# Altium schematic symbol library Wurth_Elektronik_Passive_rev16a.SCHLIB: 1143 symbols (part 15 of 27) (continued)
## WE-TCI_0603 (continued)
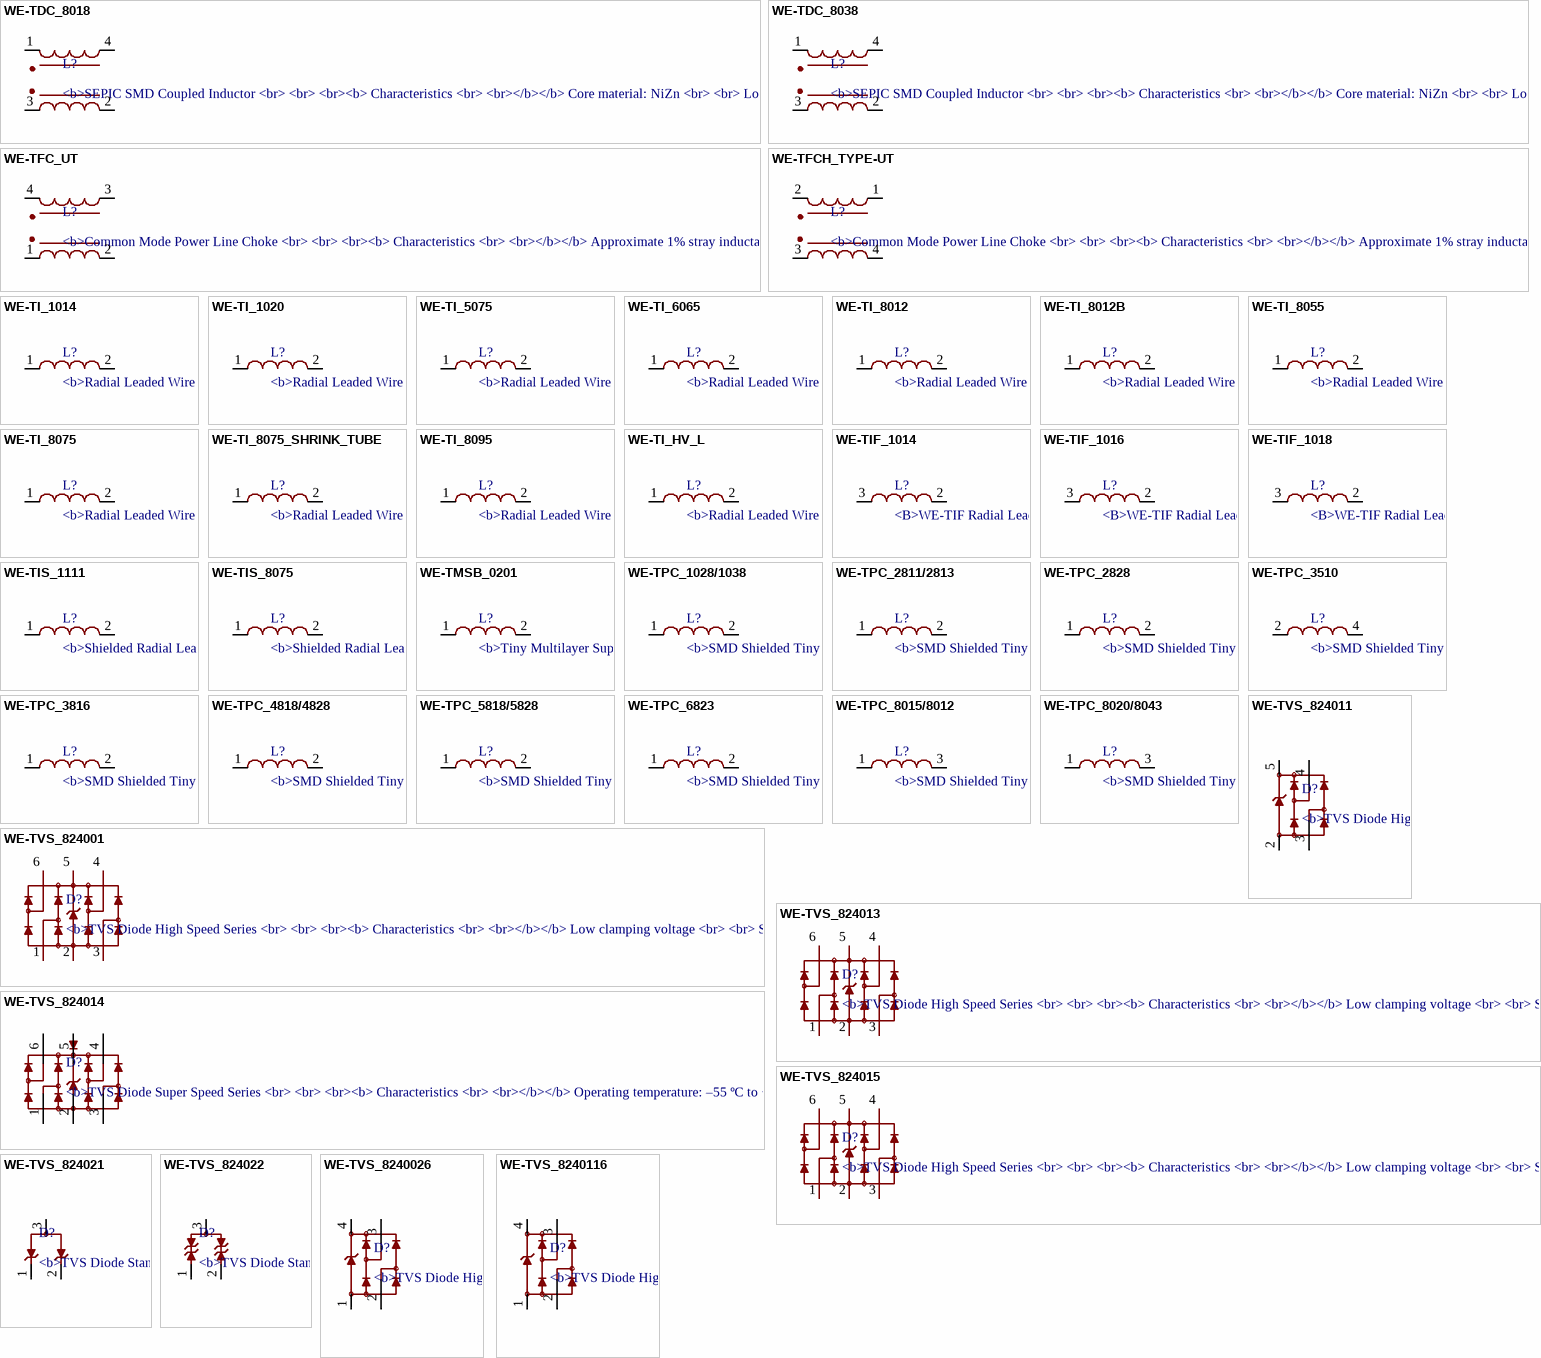
[diagram p46: symbols WE-TDC_8018 to WE-TVS_8240116]

## WE-TDC_8018
designator L?, comment <b>SEPIC SMD Coupled Inductor / <br> / <br> / <br><b> Characteristics / <br> / <br></b></b> Core material: NiZn / <br> / <br> Low profile / <br> / <br> Magnetical shielded which results in a low leakage field / <br> / <br> 8x8 mm case / <br> / <br> 1:1 transformer / <br> / <br> Low self-losses / <br> / <br> High self resonance frequency / <br> / <br> Coupled inductor with two identical windings / <br> / <br> Operating temperature: –40 °C up to +125 °C / <br> / <br> / <br> <b> Applications / <br> / <br></b> Non-isolated flyback converter / <br> / <br> Buck or Boost with AUX winding / <br> / <br> BUCK-BOOST, SEPIC, ZETA & CUK Converter / <br> / <br> Switching regulators with secondary unregulated output voltages / <br> / <br> / <br> / <br><a href="http://katalog.we-online.de/media/images/eisos/IndTDC_pf2.jpg" title="Enlarge picture"> / <img src="http://katalog.we-online.de/media/images/eisos/IndTDC_pf2.jpg" width="320"></a><p> / Details see: <a href="http://katalog.we-online.de/en/pbs/WE-TDC?">http://katalog.we-online.de/en/pbs/WE-TDC?</a><p> / </b>Updated  by  Dan Xu 2014-07-11<br> / </b>2014 (C) Wurth Elektronik
footprint WE-TDC_80XX
pins: 1, 2 3, 3 4, 4 2

## WE-TDC_8038
designator L?, comment <b>SEPIC SMD Coupled Inductor / <br> / <br> / <br><b> Characteristics / <br> / <br></b></b> Core material: NiZn / <br> / <br> Low profile / <br> / <br> Magnetical shielded which results in a low leakage field / <br> / <br> 8x8 mm case / <br> / <br> 1:1 transformer / <br> / <br> Low self-losses / <br> / <br> High self resonance frequency / <br> / <br> Coupled inductor with two identical windings / <br> / <br> Operating temperature: –40 °C up to +125 °C / <br> / <br> / <br> <b> Applications / <br> / <br></b> Non-isolated flyback converter / <br> / <br> Buck or Boost with AUX winding / <br> / <br> BUCK-BOOST, SEPIC, ZETA & CUK Converter / <br> / <br> Switching regulators with secondary unregulated output voltages / <br> / <br> / <br> / <br><a href="http://katalog.we-online.de/media/images/eisos/IndTDC_pf2.jpg" title="Enlarge picture"> / <img src="http://katalog.we-online.de/media/images/eisos/IndTDC_pf2.jpg" width="320"></a><p> / Details see: <a href="http://katalog.we-online.de/en/pbs/WE-TDC?">http://katalog.we-online.de/en/pbs/WE-TDC?</a><p> / </b>Updated  by  Dan Xu 2014-07-11<br> / </b>2014 (C) Wurth Elektronik
footprint WE-TDC_80XX
pins: 1, 2 3, 3 4, 4 2

## WE-TFC_UT
designator L?, comment <b>Common Mode Power Line Choke / <br> / <br> / <br><b> Characteristics / <br> / <br></b></b> Approximate 1% stray inductance for symmetrical interference suppression / <br> / <br> Operating temperature: –40 °C to +125 °C / <br> / <br> / <br><b> Applications / <br> / <br></b> Mains filter / <br> / <br> Suppression of common mode noise / <br> / <br> Compact switch mode power supplies / <br> / <br> Electronic ballast applications (LED bulb) / <br> / <br> Lighting / <br> / <br> White goods / <br> / <br> / <br> / <br><a href="http://katalog.we-online.de/media/images/eisos/IndTFC_MID_pf2.jpg" title="Enlarge picture"> / <img src="http://katalog.we-online.de/media/images/eisos/IndTFC_MID_pf2.jpg" width="320"></a><p> / Details see: <a href="http://katalog.we-online.de/en/pbs/WE-TFC?">http://katalog.we-online.de/en/pbs/WE-TFC?</a><p> / </b>Updated  by  Dan Xu 2014-07-11<br> / </b>2014 (C) Wurth Elektronik
footprint WE-TFC
pins: 1 4, 2 3, 3 2, 4 1

## WE-TFCH_TYPE-UT
designator L?, comment <b>Common Mode Power Line Choke / <br> / <br> / <br><b> Characteristics / <br> / <br></b></b> Approximate 1% stray inductance for symmetrical interference suppression / <br> / <br> Optimized frequency range: 10 kHz to 100 MHz / <br> / <br> Attenuation up to 65 dB / <br> / <br> Inductance tolerance: +50%/–30% / <br> / <br> Operating temperature: –40 °C to +125 °C / <br> / <br> / <br><b> Applications / <br> / <br></b> Mains filter / <br> / <br> Suppression of common mode noise / <br> / <br> Compact switch mode power supplies / <br> / <br> Electronic ballast applications (LED bulb) / <br> / <br> Lighting / <br> / <br> White goods / <br> / <br> / <br> / <br><a href="http://katalog.we-online.de/media/images/eisos/IndTFCH_pf2.jpg" title="Enlarge picture"> / <img src="http://katalog.we-online.de/media/images/eisos/IndTFCH_pf2.jpg" width="320"></a><p> / Details see: <a href="http://katalog.we-online.de/en/pbs/WE-TFCH?">http://katalog.we-online.de/en/pbs/WE-TFCH?</a><p> / </b>Updated  by  Dan Xu 2014-07-11<br> / </b>2014 (C) Wurth Elektronik
MANUFACTURER: Würth Elektronik eiSos GmbH; CREATED-BY: Christin Otto; COMPANY-URL: http://www.we-online.de; CREATED-DATE: MAR 2013; DATASHEET-URL: http://katalog.we-online.de/en/pbs/WE-TFCH?m=t&sq=tfch&sp=&sp=http%3A%2F%2Fwww.we-online.de%2Fweb%2Fen%2Felectronic_components%2Fsearchpage_PBS.php%3Fsearch%3DTFCH
footprint WE-TFCH
pins: 1 2, 2 1, 3 4, 4 3

## WE-TI_1014
designator L?, comment <b>Radial Leaded Wire Wound Inductor / <br> / <br> / <br> <b> Characteristics / <br> / <br></b></b> Radial through-hole inductor / <br> / <br> High saturation core material / <br> / <br> Small size / <br> / <br> Maximum current up to 8.5 A / <br> / <br> Custom design on request / <br> / <br> / <br><b> Applications / <br> / <br></b> Signal filtering / <br> / <br> Switches, switching power supply for small and medium voltage / <br> / <br> Power supply filter / <br> / <br> EMI filter / <br> / <br> / <br> / <br><a href="http://katalog.we-online.de/media/images/eisos/IndTI_pf2.jpg" title="Enlarge picture"> / <img src="http://katalog.we-online.de/media/images/eisos/IndTI_pf2.jpg" width="320"></a><p> / Details see: <a href="http://katalog.we-online.de/en/pbs/WE-TI?">http://katalog.we-online.de/en/pbs/WE-TI?</a><p> / </b>Updated  by  Dan Xu 2014-07-11<br> / </b>2014 (C) Wurth Elektronik
footprint WE-TI_1014
pins: 1, 2

## WE-TI_1020
designator L?, comment <b>Radial Leaded Wire Wound Inductor / <br> / <br> / <br> <b> Characteristics / <br> / <br></b></b> Radial through-hole inductor / <br> / <br> High saturation core material / <br> / <br> Small size / <br> / <br> Maximum current up to 8.5 A / <br> / <br> Custom design on request / <br> / <br> / <br><b> Applications / <br> / <br></b> Signal filtering / <br> / <br> Switches, switching power supply for small and medium voltage / <br> / <br> Power supply filter / <br> / <br> EMI filter / <br> / <br> / <br> / <br><a href="http://katalog.we-online.de/media/images/eisos/IndTI_pf2.jpg" title="Enlarge picture"> / <img src="http://katalog.we-online.de/media/images/eisos/IndTI_pf2.jpg" width="320"></a><p> / Details see: <a href="http://katalog.we-online.de/en/pbs/WE-TI?">http://katalog.we-online.de/en/pbs/WE-TI?</a><p> / </b>Updated  by  Dan Xu 2014-07-11<br> / </b>2014 (C) Wurth Elektronik
footprint WE-TI_1020
pins: 1, 2

## WE-TI_5075
designator L?, comment <b>Radial Leaded Wire Wound Inductor / <br> / <br> / <br> <b> Characteristics / <br> / <br></b></b> Radial through-hole inductor / <br> / <br> High saturation core material / <br> / <br> Small size / <br> / <br> Maximum current up to 8.5 A / <br> / <br> Custom design on request / <br> / <br> / <br><b> Applications / <br> / <br></b> Signal filtering / <br> / <br> Switches, switching power supply for small and medium voltage / <br> / <br> Power supply filter / <br> / <br> EMI filter / <br> / <br> / <br> / <br><a href="http://katalog.we-online.de/media/images/eisos/IndTI_pf2.jpg" title="Enlarge picture"> / <img src="http://katalog.we-online.de/media/images/eisos/IndTI_pf2.jpg" width="320"></a><p> / Details see: <a href="http://katalog.we-online.de/en/pbs/WE-TI?">http://katalog.we-online.de/en/pbs/WE-TI?</a><p> / </b>Updated  by  Dan Xu 2014-07-11<br> / </b>2014 (C) Wurth Elektronik
footprint WE-TI_5075
pins: 1, 2

## WE-TI_6065
designator L?, comment <b>Radial Leaded Wire Wound Inductor / <br> / <br> / <br> <b> Characteristics / <br> / <br></b></b> Radial through-hole inductor / <br> / <br> High saturation core material / <br> / <br> Small size / <br> / <br> Maximum current up to 8.5 A / <br> / <br> Custom design on request / <br> / <br> / <br><b> Applications / <br> / <br></b> Signal filtering / <br> / <br> Switches, switching power supply for small and medium voltage / <br> / <br> Power supply filter / <br> / <br> EMI filter / <br> / <br> / <br> / <br><a href="http://katalog.we-online.de/media/images/eisos/IndTI_pf2.jpg" title="Enlarge picture"> / <img src="http://katalog.we-online.de/media/images/eisos/IndTI_pf2.jpg" width="320"></a><p> / Details see: <a href="http://katalog.we-online.de/en/pbs/WE-TI?">http://katalog.we-online.de/en/pbs/WE-TI?</a><p> / </b>Updated  by  Dan Xu 2014-07-11<br> / </b>2014 (C) Wurth Elektronik
footprint WE-TI_6065
pins: 1, 2

## WE-TI_8012
designator L?, comment <b>Radial Leaded Wire Wound Inductor / <br> / <br> / <br> <b> Characteristics / <br> / <br></b></b> Radial through-hole inductor / <br> / <br> High saturation core material / <br> / <br> Small size / <br> / <br> Maximum current up to 8.5 A / <br> / <br> Custom design on request / <br> / <br> / <br><b> Applications / <br> / <br></b> Signal filtering / <br> / <br> Switches, switching power supply for small and medium voltage / <br> / <br> Power supply filter / <br> / <br> EMI filter / <br> / <br> / <br> / <br><a href="http://katalog.we-online.de/media/images/eisos/IndTI_pf2.jpg" title="Enlarge picture"> / <img src="http://katalog.we-online.de/media/images/eisos/IndTI_pf2.jpg" width="320"></a><p> / Details see: <a href="http://katalog.we-online.de/en/pbs/WE-TI?">http://katalog.we-online.de/en/pbs/WE-TI?</a><p> / </b>Updated  by  Dan Xu 2014-07-11<br> / </b>2014 (C) Wurth Elektronik
footprint WE-TI_8012
pins: 1, 2

## WE-TI_8012B
designator L?, comment <b>Radial Leaded Wire Wound Inductor / <br> / <br> / <br> <b> Characteristics / <br> / <br></b></b> Radial through-hole inductor / <br> / <br> High saturation core material / <br> / <br> Small size / <br> / <br> Maximum current up to 8.5 A / <br> / <br> Custom design on request / <br> / <br> / <br><b> Applications / <br> / <br></b> Signal filtering / <br> / <br> Switches, switching power supply for small and medium voltage / <br> / <br> Power supply filter / <br> / <br> EMI filter / <br> / <br> / <br> / <br><a href="http://katalog.we-online.de/media/images/eisos/IndTI_pf2.jpg" title="Enlarge picture"> / <img src="http://katalog.we-online.de/media/images/eisos/IndTI_pf2.jpg" width="320"></a><p> / Details see: <a href="http://katalog.we-online.de/en/pbs/WE-TI?">http://katalog.we-online.de/en/pbs/WE-TI?</a><p> / </b>Updated  by  Dan Xu 2014-07-11<br> / </b>2014 (C) Wurth Elektronik
footprint WE-TI_8012B
pins: 1, 2

## WE-TI_8055
designator L?, comment <b>Radial Leaded Wire Wound Inductor / <br> / <br> / <br> <b> Characteristics / <br> / <br></b></b> Radial through-hole inductor / <br> / <br> High saturation core material / <br> / <br> Small size / <br> / <br> Maximum current up to 8.5 A / <br> / <br> Custom design on request / <br> / <br> / <br><b> Applications / <br> / <br></b> Signal filtering / <br> / <br> Switches, switching power supply for small and medium voltage / <br> / <br> Power supply filter / <br> / <br> EMI filter / <br> / <br> / <br> / <br><a href="http://katalog.we-online.de/media/images/eisos/IndTI_pf2.jpg" title="Enlarge picture"> / <img src="http://katalog.we-online.de/media/images/eisos/IndTI_pf2.jpg" width="320"></a><p> / Details see: <a href="http://katalog.we-online.de/en/pbs/WE-TI?">http://katalog.we-online.de/en/pbs/WE-TI?</a><p> / </b>Updated  by  Dan Xu 2014-07-11<br> / </b>2014 (C) Wurth Elektronik
footprint WE-TI_8055
pins: 1, 2

## WE-TI_8075
designator L?, comment <b>Radial Leaded Wire Wound Inductor / <br> / <br> / <br> <b> Characteristics / <br> / <br></b></b> Radial through-hole inductor / <br> / <br> High saturation core material / <br> / <br> Small size / <br> / <br> Maximum current up to 8.5 A / <br> / <br> Custom design on request / <br> / <br> / <br><b> Applications / <br> / <br></b> Signal filtering / <br> / <br> Switches, switching power supply for small and medium voltage / <br> / <br> Power supply filter / <br> / <br> EMI filter / <br> / <br> / <br> / <br><a href="http://katalog.we-online.de/media/images/eisos/IndTI_pf2.jpg" title="Enlarge picture"> / <img src="http://katalog.we-online.de/media/images/eisos/IndTI_pf2.jpg" width="320"></a><p> / Details see: <a href="http://katalog.we-online.de/en/pbs/WE-TI?">http://katalog.we-online.de/en/pbs/WE-TI?</a><p> / </b>Updated  by  Dan Xu 2014-07-11<br> / </b>2014 (C) Wurth Elektronik
footprint WE-TI_8075
pins: 1, 2

## WE-TI_8075_SHRINK_TUBE
designator L?, comment <b>Radial Leaded Wire Wound Inductor / <br> / <br> / <br> <b> Characteristics / <br> / <br></b></b> Radial through-hole inductor / <br> / <br> High saturation core material / <br> / <br> Small size / <br> / <br> Maximum current up to 8.5 A / <br> / <br> Custom design on request / <br> / <br> / <br><b> Applications / <br> / <br></b> Signal filtering / <br> / <br> Switches, switching power supply for small and medium voltage / <br> / <br> Power supply filter / <br> / <br> EMI filter / <br> / <br> / <br> / <br><a href="http://katalog.we-online.de/media/images/eisos/IndTI_pf2.jpg" title="Enlarge picture"> / <img src="http://katalog.we-online.de/media/images/eisos/IndTI_pf2.jpg" width="320"></a><p> / Details see: <a href="http://katalog.we-online.de/en/pbs/WE-TI?">http://katalog.we-online.de/en/pbs/WE-TI?</a><p> / </b>Updated  by  Dan Xu 2014-07-11<br> / </b>2014 (C) Wurth Elektronik
footprint WE-TI_8075_SHRINKTUBE
pins: 1, 2

## WE-TI_8095
designator L?, comment <b>Radial Leaded Wire Wound Inductor / <br> / <br> / <br> <b> Characteristics / <br> / <br></b></b> Radial through-hole inductor / <br> / <br> High saturation core material / <br> / <br> Small size / <br> / <br> Maximum current up to 8.5 A / <br> / <br> Custom design on request / <br> / <br> / <br><b> Applications / <br> / <br></b> Signal filtering / <br> / <br> Switches, switching power supply for small and medium voltage / <br> / <br> Power supply filter / <br> / <br> EMI filter / <br> / <br> / <br> / <br><a href="http://katalog.we-online.de/media/images/eisos/IndTI_pf2.jpg" title="Enlarge picture"> / <img src="http://katalog.we-online.de/media/images/eisos/IndTI_pf2.jpg" width="320"></a><p> / Details see: <a href="http://katalog.we-online.de/en/pbs/WE-TI?">http://katalog.we-online.de/en/pbs/WE-TI?</a><p> / </b>Updated  by  Dan Xu 2014-07-11<br> / </b>2014 (C) Wurth Elektronik
footprint WE-TI_8095
pins: 1, 2

## WE-TI_HV_L
designator L?, comment <b>Radial Leaded Wire Wound Inductor / <br> / <br> / <br><br> Characteristics / <br> / <br></b></b> Radial through-hole inductor / <br> / <br> High saturation core material / <br> / <br> Unshielded construction / <br> / <br> Designed for 400 VDC / <br> / <br> / <br><b> Applications / <br> / <br></b> Non-isolated buck or buck-boost converter like Power Integrations LinkSwitch-TN / <br> / <br> Constant current LED driver / <br> / <br> Utility metering / <br> / <br> Filter for power supply / <br> / <br> / <br> / <br><a href="http://katalog.we-online.de/media/images/eisos/IndTIHV_pf2.jpg" title="Enlarge picture"> / <img src="http://katalog.we-online.de/media/images/eisos/IndTIHV_pf2.jpg" width="320"></a><p> / Details see: <a href="http://katalog.we-online.de/en/pbs/WE-TI_HV?">http://katalog.we-online.de/en/pbs/WE-TI_HV?</a><p> / </b>Updated  by  Dan Xu 2014-07-11<br> / </b>2014 (C) Wurth Elektronik
footprint WE-TI_8095
pins: 1, 2

## WE-TIF_1014
designator L?, comment <B>WE-TIF Radial Leaded Wire Wound Inductor with 4 Pins</B><BR> / <BR> / <B>Characteristics<br></b><br> / Radial through-hole inductor <br> / High saturation core material<br> / Maximum current up to 3.1 A <br> / 2 additional pins for high mechanical stability<br> / <br> / <b>Application</b><br> / <br> / Signal filtering <br> / EMI and power supply filter<br> / DC/DC converters <br> / Switching power<br> / Supplies for small and medium voltage<br> / Power supply for LED <br> / Nearfield applications <br> / <br> / <br><a href="http://katalog.we-online.de/media/images/eisos/IndTIF_pf2.jpg" title="Enlarge picture"> / <img src="http://katalog.we-online.de/media/images/eisos/IndTIF_pf2.jpg" width="320"></a><p> / Details see: <a href="http://katalog.we-online.de/en/pbs/WE-TIF">http://katalog.we-online.de/en/pbs/WE-TIF</a><p> / Updated on 2015-05-21<br> / 2015(C) Wurth Elektronik
footprint WE-TIF
pins: 2, 3 1

## WE-TIF_1016
designator L?, comment <B>WE-TIF Radial Leaded Wire Wound Inductor with 4 Pins</B><BR> / <BR> / <B>Characteristics<br></b><br> / Radial through-hole inductor <br> / High saturation core material<br> / Maximum current up to 3.1 A <br> / 2 additional pins for high mechanical stability<br> / <br> / <b>Application</b><br> / <br> / Signal filtering <br> / EMI and power supply filter<br> / DC/DC converters <br> / Switching power<br> / Supplies for small and medium voltage<br> / Power supply for LED <br> / Nearfield applications <br> / <br> / <br><a href="http://katalog.we-online.de/media/images/eisos/IndTIF_pf2.jpg" title="Enlarge picture"> / <img src="http://katalog.we-online.de/media/images/eisos/IndTIF_pf2.jpg" width="320"></a><p> / Details see: <a href="http://katalog.we-online.de/en/pbs/WE-TIF">http://katalog.we-online.de/en/pbs/WE-TIF</a><p> / Updated on 2015-05-21<br> / 2015(C) Wurth Elektronik
footprint WE-TIF_1016
pins: 2, 3 1

## WE-TIF_1018
designator L?, comment <B>WE-TIF Radial Leaded Wire Wound Inductor with 4 Pins</B><BR> / <BR> / <B>Characteristics<br></b><br> / Radial through-hole inductor <br> / High saturation core material<br> / Maximum current up to 3.1 A <br> / 2 additional pins for high mechanical stability<br> / <br> / <b>Application</b><br> / <br> / Signal filtering <br> / EMI and power supply filter<br> / DC/DC converters <br> / Switching power<br> / Supplies for small and medium voltage<br> / Power supply for LED <br> / Nearfield applications <br> / <br> / <br><a href="http://katalog.we-online.de/media/images/eisos/IndTIF_pf2.jpg" title="Enlarge picture"> / <img src="http://katalog.we-online.de/media/images/eisos/IndTIF_pf2.jpg" width="320"></a><p> / Details see: <a href="http://katalog.we-online.de/en/pbs/WE-TIF">http://katalog.we-online.de/en/pbs/WE-TIF</a><p> / Updated on 2015-05-21<br> / 2015(C) Wurth Elektronik
footprint WE-TIF
pins: 2, 3 1

## WE-TIS_1111
designator L?, comment <b>Shielded Radial Leaded Wire Wound Inductor / <br> / <br> / <br><b> Characteristics / <br> / <br></b></b> Shielded radial through-hole inductor / <br> / <br> High rated and saturation current / <br> / <br> High inductance values / <br> / <br> Low stray field / <br> / <br> / <br><b> Applications / <br> / <br></b> Filter choke / <br> / <br> Storage choke / <br> / <br> Class D amplifiers / <br> / <br> / <br> / <br><a href="http://katalog.we-online.de/media/images/eisos/IndTIS_pf2.jpg" title="Enlarge picture"> / <img src="http://katalog.we-online.de/media/images/eisos/IndTIS_pf2.jpg" width="320"></a><p> / Details see: <a href="http://katalog.we-online.de/en/pbs/WE-TIS?">http://katalog.we-online.de/en/pbs/WE-TIS?</a><p> / </b>Updated  by  Dan Xu 2014-07-11<br> / </b>2014 (C) Wurth Elektronik
footprint WE-TIS_1111
pins: 1, 2

## WE-TIS_8075
designator L?, comment <b>Shielded Radial Leaded Wire Wound Inductor / <br> / <br> / <br><b> Characteristics / <br> / <br></b></b> Shielded radial through-hole inductor / <br> / <br> High rated and saturation current / <br> / <br> High inductance values / <br> / <br> Low stray field / <br> / <br> / <br><b> Applications / <br> / <br></b> Filter choke / <br> / <br> Storage choke / <br> / <br> Class D amplifiers / <br> / <br> / <br> / <br><a href="http://katalog.we-online.de/media/images/eisos/IndTIS_pf2.jpg" title="Enlarge picture"> / <img src="http://katalog.we-online.de/media/images/eisos/IndTIS_pf2.jpg" width="320"></a><p> / Details see: <a href="http://katalog.we-online.de/en/pbs/WE-TIS?">http://katalog.we-online.de/en/pbs/WE-TIS?</a><p> / </b>Updated  by  Dan Xu 2014-07-11<br> / </b>2014 (C) Wurth Elektronik
footprint WE-TIS_8075
pins: 1, 2

## WE-TMSB_0201
designator L?, comment <b>Tiny Multilayer Suppression Bead / <br> / <br> / <br><b> Characteristics / <br> / <br></b></b> Perfect for Miniaturization of EMI solutions / <br> / <br> Wide Impedance range from 10 up to 300 Ω / <br> / <br> Operating Temperature: –55 °C to +125 °C / <br> / <br> / <br><b> Applications / <br> / <br></b> General signal and low power lines / <br> / <br> Audio-, video-, clocklines / <br> / <br> Small handheld / <br> / <br> / <br> / <br><a href="http://katalog.we-online.de/media/images/eisos/FeTMSB_pf2.jpg" title="Enlarge picture"> / <img src="http://katalog.we-online.de/media/images/eisos/FeTMSB_pf2.jpg" width="320"></a><p> / Details see: <a href="http://katalog.we-online.de/en/pbs/WE-TMSB?">http://katalog.we-online.de/en/pbs/WE-TMSB?</a><p> / </b>Updated  by  Dan Xu 2014-07-11<br> / </b>2014 (C) Wurth Elektronik
MANUFACTURER: Würth Elektronik eiSos GmbH; CREATED-BY: Christin Otto; COMPANY-URL: http://www.we-online.de; CREATED-DATE: August 2013; DATASHEET-URL: http://katalog.we-online.de/de/pbs/WE-TMSB?sid=4c5a5b26c6
footprint WE-TMSB_0201
pins: 1, 2

## WE-TPC_1028/1038
designator L?, comment <b>SMD Shielded Tiny Power Inductor / <br> / <br> / <br><b> Characteristics / <br> / <br></b></b> Extremely flat power inductor / <br> / <br> High current capability / <br> / <br> Magnetically shielded which results in a low leakage field / <br> / <brr> Operating temperature: –40 °C to +125 °C / <br> / <br> / <br><b> Applications / <br> / <br></b> Portable power like PDA, digital camera, PCMCIA cards and displays / <br> / <br> DC/DC converter / <br> / <br> Embedded PC / <br> / <br> Mobile data gathering, telemetric / <br> / <br> / <br> / <br><a href="http://katalog.we-online.de/media/images/eisos/IndTPC_pf2.jpg" title="Enlarge picture"> / <img src="http://katalog.we-online.de/media/images/eisos/IndTPC_pf2.jpg" width="320"></a><p> / Details see: <a href="http://katalog.we-online.de/en/pbs/WE-TPC?">http://katalog.we-online.de/en/pbs/WE-TPC?</a><p> / </b>Updated  by  Dan Xu 2014-07-11<br> / </b>2014 (C) Wurth Elektronik
footprint WE-TPC_1028/1038
pins: 1, 2

## WE-TPC_2811/2813
designator L?, comment <b>SMD Shielded Tiny Power Inductor / <br> / <br> / <br><b> Characteristics / <br> / <br></b></b> Extremely flat power inductor / <br> / <br> High current capability / <br> / <br> Magnetically shielded which results in a low leakage field / <br> / <brr> Operating temperature: –40 °C to +125 °C / <br> / <br> / <br><b> Applications / <br> / <br></b> Portable power like PDA, digital camera, PCMCIA cards and displays / <br> / <br> DC/DC converter / <br> / <br> Embedded PC / <br> / <br> Mobile data gathering, telemetric / <br> / <br> / <br> / <br><a href="http://katalog.we-online.de/media/images/eisos/IndTPC_pf2.jpg" title="Enlarge picture"> / <img src="http://katalog.we-online.de/media/images/eisos/IndTPC_pf2.jpg" width="320"></a><p> / Details see: <a href="http://katalog.we-online.de/en/pbs/WE-TPC?">http://katalog.we-online.de/en/pbs/WE-TPC?</a><p> / </b>Updated  by  Dan Xu 2014-07-11<br> / </b>2014 (C) Wurth Elektronik
footprint WE-TPC_2811/2813
pins: 1, 2

## WE-TPC_2828
designator L?, comment <b>SMD Shielded Tiny Power Inductor / <br> / <br> / <br><b> Characteristics / <br> / <br></b></b> Extremely flat power inductor / <br> / <br> High current capability / <br> / <br> Magnetically shielded which results in a low leakage field / <br> / <brr> Operating temperature: –40 °C to +125 °C / <br> / <br> / <br><b> Applications / <br> / <br></b> Portable power like PDA, digital camera, PCMCIA cards and displays / <br> / <br> DC/DC converter / <br> / <br> Embedded PC / <br> / <br> Mobile data gathering, telemetric / <br> / <br> / <br> / <br><a href="http://katalog.we-online.de/media/images/eisos/IndTPC_pf2.jpg" title="Enlarge picture"> / <img src="http://katalog.we-online.de/media/images/eisos/IndTPC_pf2.jpg" width="320"></a><p> / Details see: <a href="http://katalog.we-online.de/en/pbs/WE-TPC?">http://katalog.we-online.de/en/pbs/WE-TPC?</a><p> / </b>Updated  by  Dan Xu 2014-07-11<br> / </b>2014 (C) Wurth Elektronik
footprint WE-TPC_2828
pins: 1, 2

## WE-TPC_3510
designator L?, comment <b>SMD Shielded Tiny Power Inductor / <br> / <br> / <br><b> Characteristics / <br> / <br></b></b> Extremely flat power inductor / <br> / <br> High current capability / <br> / <br> Magnetically shielded which results in a low leakage field / <br> / <brr> Operating temperature: –40 °C to +125 °C / <br> / <br> / <br><b> Applications / <br> / <br></b> Portable power like PDA, digital camera, PCMCIA cards and displays / <br> / <br> DC/DC converter / <br> / <br> Embedded PC / <br> / <br> Mobile data gathering, telemetric / <br> / <br> / <br> / <br><a href="http://katalog.we-online.de/media/images/eisos/IndTPC_pf2.jpg" title="Enlarge picture"> / <img src="http://katalog.we-online.de/media/images/eisos/IndTPC_pf2.jpg" width="320"></a><p> / Details see: <a href="http://katalog.we-online.de/en/pbs/WE-TPC?">http://katalog.we-online.de/en/pbs/WE-TPC?</a><p> / </b>Updated  by  Dan Xu 2014-07-11<br> / </b>2014 (C) Wurth Elektronik
footprint WE-TPC_3510
pins: 2 1, 4 2

## WE-TPC_3816
designator L?, comment <b>SMD Shielded Tiny Power Inductor / <br> / <br> / <br><b> Characteristics / <br> / <br></b></b> Extremely flat power inductor / <br> / <br> High current capability / <br> / <br> Magnetically shielded which results in a low leakage field / <br> / <brr> Operating temperature: –40 °C to +125 °C / <br> / <br> / <br><b> Applications / <br> / <br></b> Portable power like PDA, digital camera, PCMCIA cards and displays / <br> / <br> DC/DC converter / <br> / <br> Embedded PC / <br> / <br> Mobile data gathering, telemetric / <br> / <br> / <br> / <br><a href="http://katalog.we-online.de/media/images/eisos/IndTPC_pf2.jpg" title="Enlarge picture"> / <img src="http://katalog.we-online.de/media/images/eisos/IndTPC_pf2.jpg" width="320"></a><p> / Details see: <a href="http://katalog.we-online.de/en/pbs/WE-TPC?">http://katalog.we-online.de/en/pbs/WE-TPC?</a><p> / </b>Updated  by  Dan Xu 2014-07-11<br> / </b>2014 (C) Wurth Elektronik
footprint WE-TPC_3816
pins: 1, 2

## WE-TPC_4818/4828
designator L?, comment <b>SMD Shielded Tiny Power Inductor / <br> / <br> / <br><b> Characteristics / <br> / <br></b></b> Extremely flat power inductor / <br> / <br> High current capability / <br> / <br> Magnetically shielded which results in a low leakage field / <br> / <brr> Operating temperature: –40 °C to +125 °C / <br> / <br> / <br><b> Applications / <br> / <br></b> Portable power like PDA, digital camera, PCMCIA cards and displays / <br> / <br> DC/DC converter / <br> / <br> Embedded PC / <br> / <br> Mobile data gathering, telemetric / <br> / <br> / <br> / <br><a href="http://katalog.we-online.de/media/images/eisos/IndTPC_pf2.jpg" title="Enlarge picture"> / <img src="http://katalog.we-online.de/media/images/eisos/IndTPC_pf2.jpg" width="320"></a><p> / Details see: <a href="http://katalog.we-online.de/en/pbs/WE-TPC?">http://katalog.we-online.de/en/pbs/WE-TPC?</a><p> / </b>Updated  by  Dan Xu 2014-07-11<br> / </b>2014 (C) Wurth Elektronik
footprint WE-TPC_4818/4828
pins: 1, 2

## WE-TPC_5818/5828
designator L?, comment <b>SMD Shielded Tiny Power Inductor / <br> / <br> / <br><b> Characteristics / <br> / <br></b></b> Extremely flat power inductor / <br> / <br> High current capability / <br> / <br> Magnetically shielded which results in a low leakage field / <br> / <brr> Operating temperature: –40 °C to +125 °C / <br> / <br> / <br><b> Applications / <br> / <br></b> Portable power like PDA, digital camera, PCMCIA cards and displays / <br> / <br> DC/DC converter / <br> / <br> Embedded PC / <br> / <br> Mobile data gathering, telemetric / <br> / <br> / <br> / <br><a href="http://katalog.we-online.de/media/images/eisos/IndTPC_pf2.jpg" title="Enlarge picture"> / <img src="http://katalog.we-online.de/media/images/eisos/IndTPC_pf2.jpg" width="320"></a><p> / Details see: <a href="http://katalog.we-online.de/en/pbs/WE-TPC?">http://katalog.we-online.de/en/pbs/WE-TPC?</a><p> / </b>Updated  by  Dan Xu 2014-07-11<br> / </b>2014 (C) Wurth Elektronik
footprint WE-TPC_5818/5828
pins: 1, 2

## WE-TPC_6823
designator L?, comment <b>SMD Shielded Tiny Power Inductor / <br> / <br> / <br><b> Characteristics / <br> / <br></b></b> Extremely flat power inductor / <br> / <br> High current capability / <br> / <br> Magnetically shielded which results in a low leakage field / <br> / <brr> Operating temperature: –40 °C to +125 °C / <br> / <br> / <br><b> Applications / <br> / <br></b> Portable power like PDA, digital camera, PCMCIA cards and displays / <br> / <br> DC/DC converter / <br> / <br> Embedded PC / <br> / <br> Mobile data gathering, telemetric / <br> / <br> / <br> / <br><a href="http://katalog.we-online.de/media/images/eisos/IndTPC_pf2.jpg" title="Enlarge picture"> / <img src="http://katalog.we-online.de/media/images/eisos/IndTPC_pf2.jpg" width="320"></a><p> / Details see: <a href="http://katalog.we-online.de/en/pbs/WE-TPC?">http://katalog.we-online.de/en/pbs/WE-TPC?</a><p> / </b>Updated  by  Dan Xu 2014-07-11<br> / </b>2014 (C) Wurth Elektronik
footprint WE-TPC_6823
pins: 1, 2

## WE-TPC_8015/8012
designator L?, comment <b>SMD Shielded Tiny Power Inductor / <br> / <br> / <br><b> Characteristics / <br> / <br></b></b> Extremely flat power inductor / <br> / <br> High current capability / <br> / <br> Magnetically shielded which results in a low leakage field / <br> / <brr> Operating temperature: –40 °C to +125 °C / <br> / <br> / <br><b> Applications / <br> / <br></b> Portable power like PDA, digital camera, PCMCIA cards and displays / <br> / <br> DC/DC converter / <br> / <br> Embedded PC / <br> / <br> Mobile data gathering, telemetric / <br> / <br> / <br> / <br><a href="http://katalog.we-online.de/media/images/eisos/IndTPC_pf2.jpg" title="Enlarge picture"> / <img src="http://katalog.we-online.de/media/images/eisos/IndTPC_pf2.jpg" width="320"></a><p> / Details see: <a href="http://katalog.we-online.de/en/pbs/WE-TPC?">http://katalog.we-online.de/en/pbs/WE-TPC?</a><p> / </b>Updated  by  Dan Xu 2014-07-11<br> / </b>2014 (C) Wurth Elektronik
footprint WE-TPC_8015/8012
pins: 1, 3 2